# Altium integrated library SH_Library.IntLib: 135 symbols
Pins are listed as number, name and electrical type; pins without a type are passive.

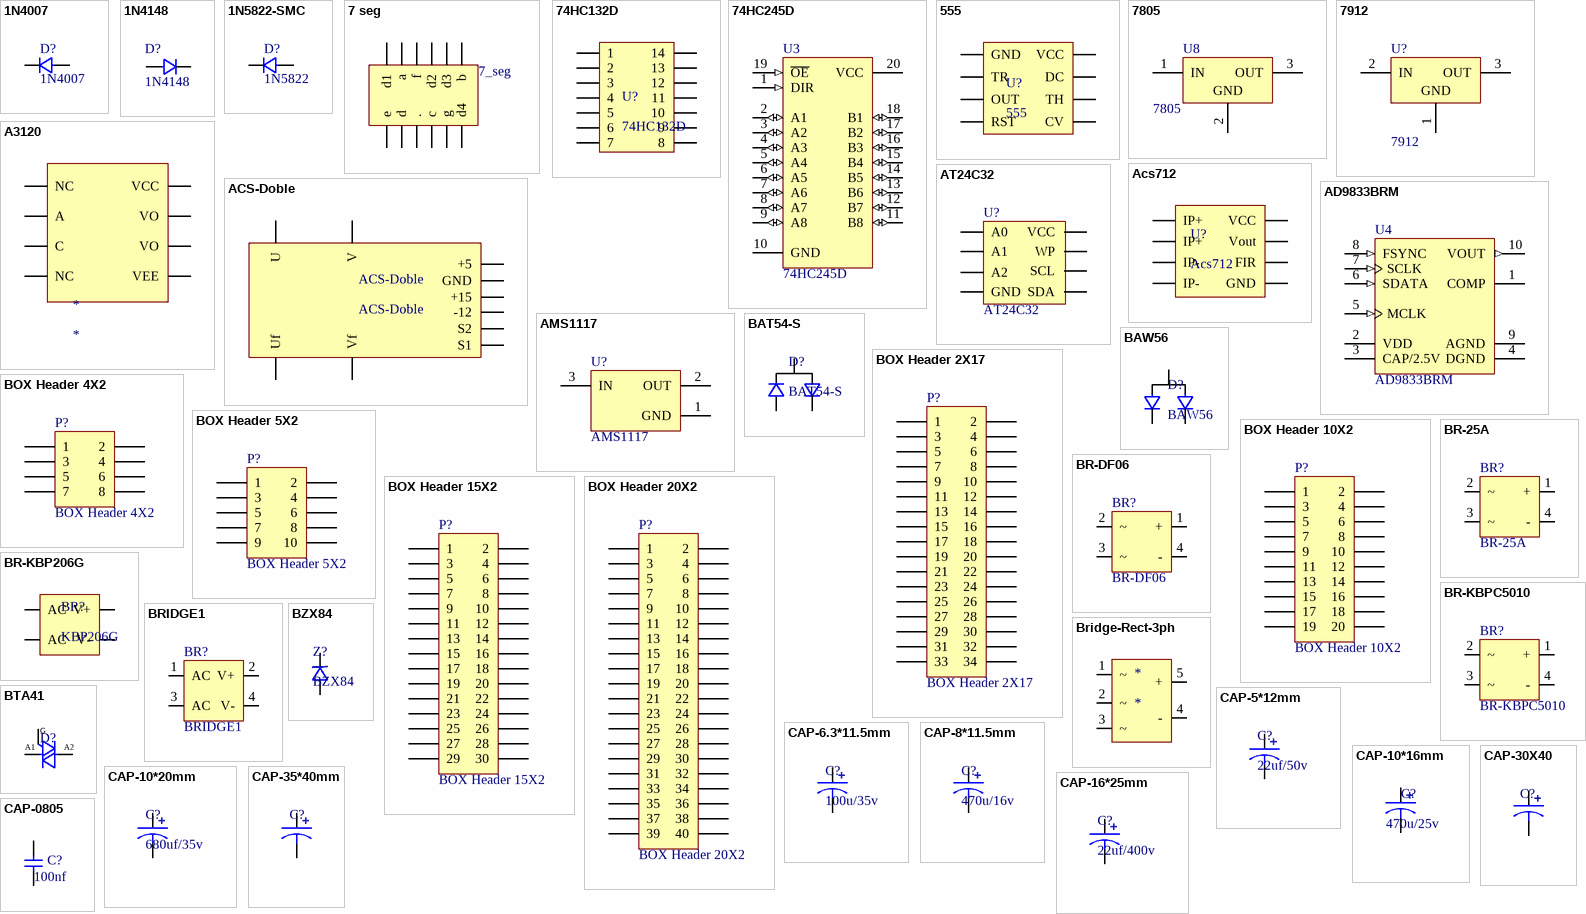
[diagram p0: symbols 1N4007 to CAP-0805]

## 1N4007
designator D?
Diode
footprint DIODE-SMA
footprint DO-41
pins: 1 K, 2 A

## 1N4148
designator D?
Diode
footprint 1N4148
footprint DO-35
pins: 1 A, 2 K

## 1N5822-SMC
designator D?, comment 1N5822
Diode
footprint DIODE-SMC
footprint DO-201AD
pins: 1 K, 2 A

## 7 seg
designator 7_seg, comment 7_seg  (value not drawn)
footprint 7_seg
pins: 1 d1, 2 a, 3 f, 4 d2, 5 d3, 6 b, 7 e, 8 d, 9 ., 10 c, 11 g, 12 d4

## 74HC132D
designator U?
footprint SOIC-7Pin
pins: 1, 2, 3, 4, 5, 6, 7, 8, 9, 10, 11, 12, 13, 14

## 74HC245D
designator U3
Octal 3-State Non-Inverting Bus Transceiver; Published: 15-Apr-2002; LatestRevisionDate: 13-Apr-2006; LatestRevisionNote: IPC-7351 Footprint Added.; DatasheetVersion: Mar-2000; PackageReference: 751D-05; Publisher: Altium Limited; PackageDescription: 20-Pin Small Outline Integrated Circuit 1.27 mm Pitch; ComponentLink1Description: Manufacturer Link; ComponentLink1URL: http://www.onsemi.com/; ComponentLink2Description: Datasheet; ComponentLink2URL: http://www.onsemi.com/pub/Collateral/MC74HC245A-D.PDF
footprint SOIC_20Leads (SOIC, 20-Leads, Body 12.8x7.5mm, Pitch 1.27mm, IPC High Density)
footprint TSSOP-20 Leads (Shrink Small Outline; 20 Leads; Body Width 4.4 mm; Pitch 0.65 mm)
pins: 1 DIR (in), 2 A1 (io), 3 A2 (io), 4 A3 (io), 5 A4 (io), 6 A5 (io), 7 A6 (io), 8 A7 (io), 9 A8 (io), 10 GND (power), 11 B8 (io), 12 B7 (io), 13 B6 (io), 14 B5 (io), 15 B4 (io), 16 B3 (io), 17 B2 (io), 18 B1 (io), 19 ~{OE} (in), 20 VCC (power)

## 555
designator U?
footprint SO-8-N
pins: 1 GND, 2 TR, 3 OUT, 4 RST, 5 CV, 6 TH, 7 DC, 8 VCC

## 7805
designator U8
PartNumber: L7812CV; DatasheetVersion: Nov-2011; PackageVersion: ver3.0; PackageReference: TO220; PackageDescription: TO, Thru-Hole, Vertical, Heatsink Mounted; 3 In-Line Leads; Pitch 2.54 mm; ComponentLink1Description: Manufacturer URL; ComponentLink1URL: http://www.st.com; ComponentLink2Description: Datasheet; ComponentLink2URL: http://www.st.com/internet/com/TECHNICAL_RESOURCES/TECHNICAL_LITERATURE/DATASHEET/CD00000444.pdf; ComponentLink3Description: Package Specification; ComponentLink3URL: http://www.st.com/internet/com/TECHNICAL_RESOURCES/TECHNICAL_LITERATURE/PACKAGE_INFORMATION/CD00004649.pdf
footprint D2PAK
footprint TO-220
footprint TO-252
pins: 1 IN (power), 2 GND (power), 3 OUT (power)

## 7912
designator U?
Three-Terminal Negative Voltage Regulator; Note: Pin 4 is TAB; Pin 2 is trimmed; Published: 15-Apr-2002; DatasheetVersion: 1996; PackageVersion: 1997; PackageReference: 936-03; Publisher: Altium Limited; PackageDescription: D2-PAK/TO-263-AB; 3 Leads (1 Cropped); Body 14.7 (inc. leads) x 10.2 mm (LxW max); ComponentLink1Description: Manufacturer Link; ComponentLink1URL: http://www.onsemi.com/site/products/taxonomy/0,4438,503,00.html; ComponentLink2Description: Datasheet; ComponentLink2URL: http://www.onsemi.com/pub/Collateral/MC7900-D.PDF
footprint TO-252
pins: 1 GND (power), 2 IN (power), 3 OUT (power)

## A3120
designator *
footprint SMD-8
pins: 1 NC, 2 A, 3 C, 4 NC, 5 VEE, 6 VO, 7 VO, 8 VCC

## Acs712
designator U?
footprint SO-8-N
pins: 1 IP+, 2 IP+, 3 IP-, 4 IP-, 5 GND, 6 FIR, 7 Vout, 8 VCC

## ACS-Doble
designator ACS-Doble
footprint ACS-Doble-empty
pins: +5, +15, -12, GND, S1, S2, u U, uf Uf, v V, vf Vf

## AD9833BRM
designator U4
Low Power, 12.65 mW, 2.3 V to 5.5 V, Programmable Waveform Generator, 10-Bit, Serial, RM-10, 50 Tube; Master fclk: 25MHz; Resolution (Bits): 10bit; Tuning Word Width (bits): 28bit; REFCLK Multiplier: No; Compliance Range (V): 650mV; FS Iout (mA nom): 3mA; I Supply total (max): 5.5mA; DatasheetVersion: Rev. D; PackageVersion: 5/8/2005; PackageReference: RM-10; PackageDescription: 10-Lead Mini Small Outline Package [MSOP]; I/O Interface: Serial; Code_JEDEC: MO-187-BA; ComponentLink1Description: Manufacturer URL; ComponentLink1URL: www.analog.com; ComponentLink2Description: Datasheet; ComponentLink2URL: http://www.analog.com/static/imported-files/data_sheets/AD9833.pdf; ComponentLink3Description: Package Specification; ComponentLink3URL: http://www.analog.com/static/imported-files/packages/PKG_PDF/MSOP%28RM%29/RM_10.pdf
footprint TSSOP-10Leads (TSSOP, 10-Leads, Body 3x3mm, Pitch 0.5mm, IPC High Density)
pins: 1 COMP "DAC Bias Pin. This pin is used for decoupling the DAC bias voltage.", 2 VDD (power) "Positive Power Supply for the Analog and Digital Interface Sections. The on-board 2.5 V regulator is also supplied from VDD. VDD can have a value from 2.3 V to 5.5 V. [see datasheet]", 3 CAP/2.5V (power) "The digital circuitry operates from a 2.5 V power supply. This 2.5 V is generated from VDD using an on-board regulator when VDD exceeds 2.7 V. [see datasheet]", 4 DGND (power) "Digital Ground.", 5 MCLK (in) "Digital Clock Input. DDS output frequencies are expressed as a binary fraction of the frequency of MCLK. The output frequency accuracy and phase noise are determined by this clock.", 6 SDATA (in) "Serial Data Input. The 16-bit serial data-word is applied to this input.", 7 SCLK (in) "Serial Clock Input. Data is clocked into the AD9833 on each falling edge of SCLK.", 8 FSYNC (in) "Active Low Control Input. FSYNC is the frame synchronization signal for the input data. When FSYNC is taken low, the internal logic is informed that a new word is being loaded into the device. [see datasheet]", 9 AGND (power) "Analog Ground.", 10 VOUT (out) "Voltage Output. The analog and digital output from the AD9833 is available at this pin. An external load resistor is not required because the device has a 200  ohm resistor on board."

## AMS1117
designator U?
800mA SOT-223; PartNumber: LM1117MP-3.3; Manufacturer: National Semiconductor; PackageTopMarking: XYTT*N05A; PowerWise: N; CompType: LDO IC; High-Reliability: Y; DatasheetVersion: Apr-2006; PackageVersion: revB, Apr-2003; PackageReference: MP04A; PackageDescription: Molded SOT-223, 6.50 x 3.56 x 1.6mm Body, 4 Lead, 2.3mm Pitch; RoHS: N; PinCount: 4; Code_JEDEC: TO-261-AA; Code_IPC: SOT223-4; ComponentLink1Description: Manufacturer URL; ComponentLink1URL: http://www.national.com/; ComponentLink2Description: LM1117 Datasheet; ComponentLink2URL: http://www.national.com/ds/LM/LM1117.pdf; ComponentLink3Description: LM1117 Web Page; ComponentLink3URL: http://www.national.com/pf/LM/LM1117.html; ComponentLink4Description: MP04A Package Page; ComponentLink4URL: http://www.national.com/packaging/folders/mp04a.html
footprint AMS1117-SOT223
pins: 1 GND (power), 2 OUT (power), 3 IN (power)

## AT24C32
designator U?
footprint SO-8-N
pins: 1 A0, 2 A1, 3 A2, 4 GND, 5 SDA, 6 SCL, 7 WP, 8 VCC

## BAT54-S
designator D?
footprint SOT23
pins: 1 K, 2 K, 3

## BAW56
designator D?
footprint SOT23
pins: 1 K, 2 K, 3

## BOX Header 2X17
designator P?
Header, 17-Pin, Dual row; LatestRevisionDate: 17-Jul-2002; LatestRevisionNote: Re-released for DXP Platform.; Publisher: Altium Limited
footprint BOX Header 2X17
footprint BOX Header 2X17 RA
pins: 1, 2, 3, 4, 5, 6, 7, 8, 9, 10, 11, 12, 13, 14, 15, 16, 17, 18, 19, 20, 21, 22, 23, 24, 25, 26, 27, 28, 29, 30, 31, 32, 33, 34

## BOX Header 4X2
designator P?
Header, 4-Pin, Dual row; LatestRevisionDate: 17-Jul-2002; LatestRevisionNote: Re-released for DXP Platform.; Publisher: Altium Limited
footprint BOX-HEADER-2X4
pins: 1, 2, 3, 4, 5, 6, 7, 8

## BOX Header 5X2
designator P?
Header, 5-Pin, Dual row; LatestRevisionDate: 17-Jul-2002; LatestRevisionNote: Re-released for DXP Platform.; Publisher: Altium Limited
footprint BOX-HEADER-2X5
pins: 1, 2, 3, 4, 5, 6, 7, 8, 9, 10

## BOX Header 10X2
designator P?
Header, 10-Pin, Dual row; LatestRevisionDate: 17-Jul-2002; LatestRevisionNote: Re-released for DXP Platform.; Publisher: Altium Limited
footprint BOX-HEADER-2X10
pins: 1, 2, 3, 4, 5, 6, 7, 8, 9, 10, 11, 12, 13, 14, 15, 16, 17, 18, 19, 20

## BOX Header 15X2
designator P?
Header, 15-Pin; LatestRevisionDate: 17-Jul-2002; LatestRevisionNote: Re-released for DXP Platform.; Publisher: Altium Limited
footprint BOX-HEADER-2X15
pins: 1, 2, 3, 4, 5, 6, 7, 8, 9, 10, 11, 12, 13, 14, 15, 16, 17, 18, 19, 20, 21, 22, 23, 24, 25, 26, 27, 28, 29, 30

## BOX Header 20X2
designator P?
Header, 20-Pin, Dual row; LatestRevisionDate: 17-Jul-2002; LatestRevisionNote: Re-released for DXP Platform.; Publisher: Altium Limited
footprint BOX-HEADER-2X20
pins: 1, 2, 3, 4, 5, 6, 7, 8, 9, 10, 11, 12, 13, 14, 15, 16, 17, 18, 19, 20, 21, 22, 23, 24, 25, 26, 27, 28, 29, 30, 31, 32, 33, 34, 35, 36, 37, 38, 39, 40

## BR-25A
designator BR?
footprint BR-25A
pins: 1 +, 2 ~, 3 ~, 4 -

## BR-DF06
designator BR?
footprint DF06
pins: 1 +, 2 ~, 3 ~, 4 -

## BR-KBP206G
designator BR?, comment KBP206G
footprint KBP206G
footprint KBU810
pins: 1 V+, 2 AC, 3 AC, 4 V-

## BR-KBPC5010
designator BR?
footprint KBPC5010
footprint KBPC5010W
pins: 1 +, 2 ~, 3 ~, 4 -

## BRIDGE1
designator BR?
Diode Bridge
footprint BRIDGE1
footprint BR-SMA
pins: 1 AC, 2 V+, 3 AC, 4 V-

## Bridge-Rect-3ph
designator *
footprint Bridge_Rect_3ph
pins: 1 ~, 2 ~, 3 ~, 4 -, 5 +

## BTA41
designator D?  (value not drawn)
footprint TO-264-N
pins: 1, 2 A, 3
text: G; A1; A2

## BZX84
designator Z?
footprint SOT23
pins: 2 K, 3

## CAP-5*12mm
designator C?, comment 22uf/50v
Capacitor
footprint CAP-5*12mm
pins: 1, 2

## CAP-6.3*11.5mm
designator C?, comment 100u/35v
Capacitor
footprint CAP-6.3*11.5mm
pins: 1, 2

## CAP-8*11.5mm
designator C?, comment 470u/16v
Capacitor
footprint CAP-8*11.5mm
pins: 1, 2

## CAP-10*16mm
designator C?, comment 470u/25v
Capacitor
footprint CAP-10*16mm
pins: 1, 2

## CAP-10*20mm
designator C?, comment 680uf/35v
Capacitor
footprint CAP-10*20mm
pins: 1, 2

## CAP-16*25mm
designator C?, comment 22uf/400v
Capacitor
footprint CAP-16*25mm
pins: 1, 2

## CAP-30X40
designator C?  (value not drawn)
footprint CAP-30X40
pins: 1, 2

## CAP-35*40mm
designator C?, comment 680UF/450V  (value not drawn)
Capacitor
footprint CAP-35*40mm
pins: 1, 2

## CAP-0805
designator C?, comment 100nf
Capacitor
footprint cap-0805
pins: 1, 2

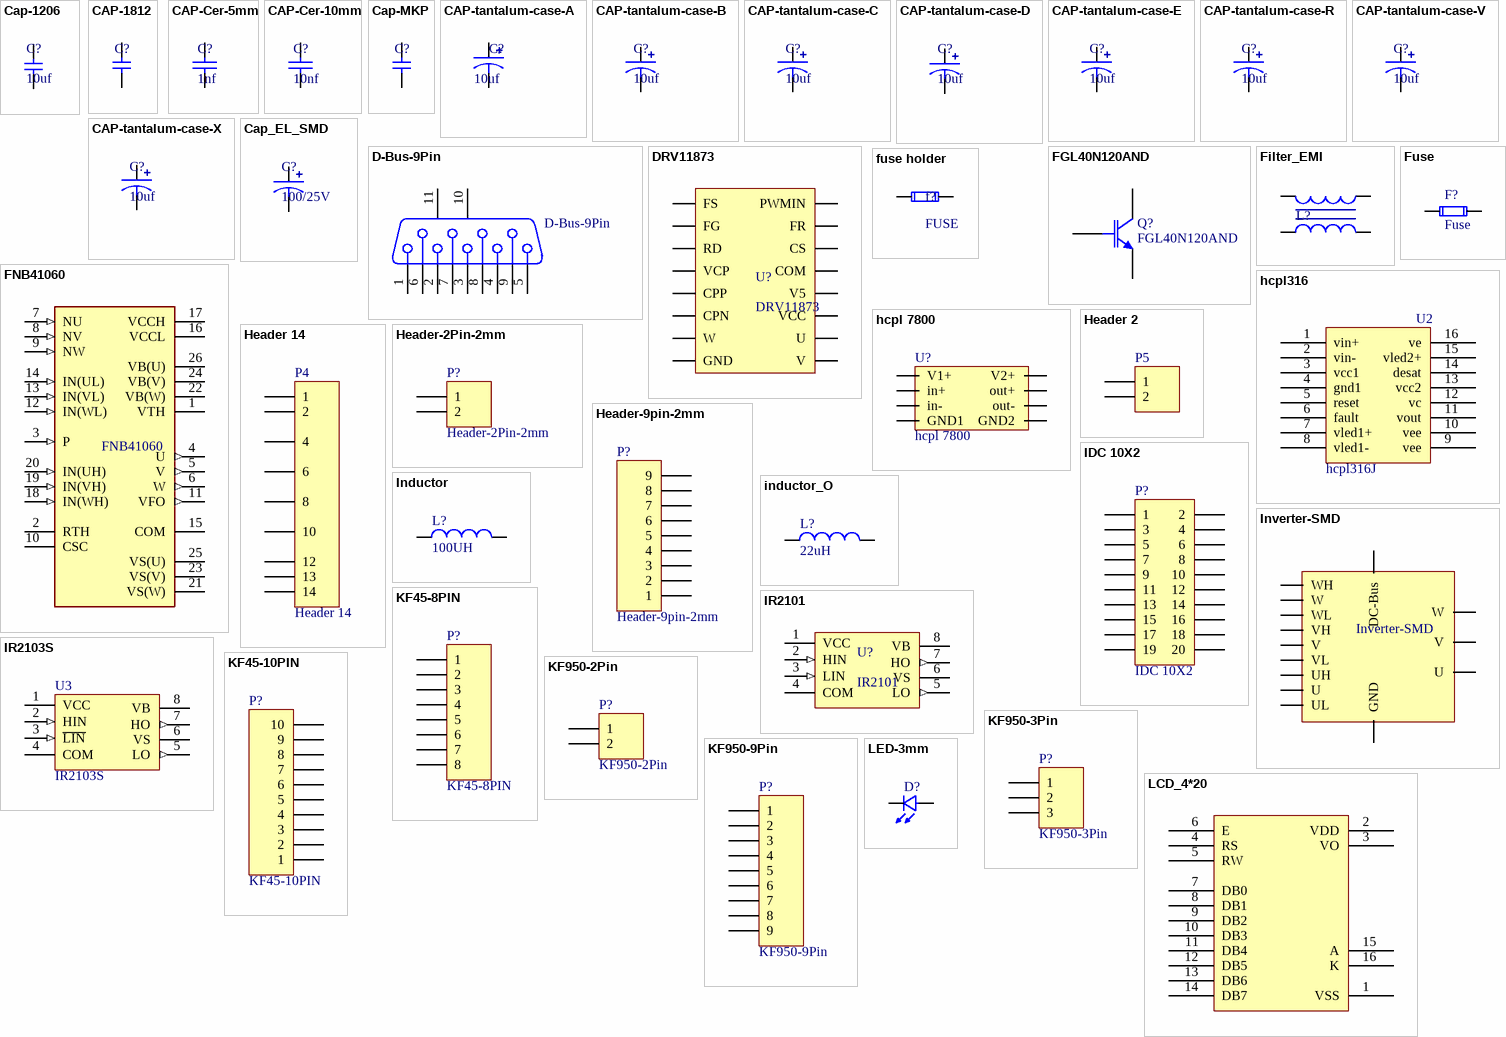
[diagram p1: symbols Cap-1206 to LED-3mm]

## Cap-1206
designator C?, comment 10uf
footprint CAP_1206
pins: 1, 2

## CAP-1812
designator C?  (value not drawn)
footprint CAP-1812
pins: 1, 2

## CAP-Cer-5mm
designator C?, comment 1nf
Capacitor
footprint CAP-Cer-5mm
pins: 1, 2

## CAP-Cer-10mm
designator C?, comment 10nf
Capacitor
footprint CAP-Cer-10mm
pins: 1, 2

## Cap-MKP
designator C?  (value not drawn)
footprint CAP-MKP-W3-H8-L10
footprint CAP-MKP-W6-H12-L18
footprint CAP-MKP-W8-H17-L21
pins: 1, 2

## CAP-tantalum-case-A
designator C?, comment 10uf
Capacitor
footprint TAN-CASE-A
pins: 1, 2

## CAP-tantalum-case-B
designator C?, comment 10uf
Capacitor
footprint TAN-CASE-B
pins: 1, 2

## CAP-tantalum-case-C
designator C?, comment 10uf
Capacitor
footprint TAN-CASE-C
pins: 1, 2

## CAP-tantalum-case-D
designator C?, comment 10uf
Capacitor
footprint TAN-CASE-D
pins: 1, 2

## CAP-tantalum-case-E
designator C?, comment 10uf
Capacitor
footprint TAN-CASE-E
pins: 1, 2

## CAP-tantalum-case-R
designator C?, comment 10uf
Capacitor
footprint TAN-CASE-R
pins: 1, 2

## CAP-tantalum-case-V
designator C?, comment 10uf
Capacitor
footprint TAN-CASE-V
pins: 1, 2

## CAP-tantalum-case-X
designator C?, comment 10uf
Capacitor
footprint TAN-CASE-X
pins: 1, 2

## Cap_EL_SMD
designator C?, comment 100/25V
footprint CAP_SMD-11X10
footprint CAP_SMD-7.3X6.6
footprint CAP-SMD-5X5.4
pins: 1, 2

## D-Bus-9Pin
designator D-Bus-9Pin  (value not drawn)
Receptacle Assembly, 9 Position, Right Angle; PackageDocument: O; Positions: 9; Published: 15-Jun-2001; LatestRevisionDate: 17-Jul-2002; LatestRevisionNote: Re-released for DXP Platform.; DatasheetDocument: 1-Sep-1999; PackageReference: 788750; Publisher: Altium Limited; Orientation: Right Angle; Gender: Receptacle
footprint D-Bus-9Pin
pins: 1, 2, 3, 4, 5, 6, 7, 8, 9, 10 MH1, 11 MH2

## DRV11873
designator U?
footprint TSSOP-16PIN
pins: 1 FS, 2 FG, 3 RD, 4 VCP, 5 CPP, 6 CPN, 7 W, 8 GND, 9 V, 10 U, 11 VCC, 12 V5, 13 COM, 14 CS, 15 FR, 16 PWMIN

## FGL40N120AND
designator Q?
Nch IGBT for Strobe Flasher; Published: 30-Oct-2009; DatasheetVersion: Rev.2.00, Jul-2005; PackageVersion: Sep-2005; PackageReference: PRSS0003AB-A; Publisher: Altium Limited; PackageDescription: TO, Thru-Hole, Vertical, Heatsink Mounted; 3 In-Line Leads; Pitch 2.54 mm (TO-220FN); ComponentLink1Description: Manufacturer Link; ComponentLink1URL: http://sg.renesas.com/fmwk.jsp?cnt=discrete_category_landing.jsp&fp=/products/discrete/; ComponentLink2Description: Datasheet; ComponentLink2URL: http://documentation.renesas.com/eng/products/transistor/rej03g0286_ct40km8h.pdf; ComponentLink3Description: Packaging Specification; ComponentLink3URL: http://sg.renesas.com/media/products/common_info/package/pdf/transistor/code/prss0003ab_a.pdf
footprint TO-264
pins: 1 G, 2 C, 3 E

## Filter_EMI
designator L?
Filter_EMI; Code_IEC: 1005; Value: 10mH; Published: 8-Jun-2000; LatestRevisionDate: 29-May-2009; LatestRevisionNote: IPC-7351 Footprint Added.; PackageReference: 0402-A; Publisher: Altium Limited; PackageDescription: Chip Inductor; Code_JEITA: 0402
footprint FILTER-EMI
footprint FILTER-EMI-2
pins: 1, 2, 3, 4

## FNB41060
designator FNB41060  (value not drawn)
footprint FBN41060
pins: 1 VTH (power), 2 RTH, 3 P (in), 4 U (out), 5 V (out), 6 W (out), 7 NU (in), 8 NV (in), 9 NW (in), 10 CSC, 11 VFO (out), 12 IN(WL) (in), 13 IN(VL) (in), 14 IN(UL) (in), 15 COM (power), 16 VCCL (power), 17 VCCH (power), 18 IN(WH) (in), 19 IN(VH) (in), 20 IN(UH) (in), 21 VS(W) (power), 22 VB(W) (power), 23 VS(V) (power), 24 VB(V) (power), 25 VS(U) (power), 26 VB(U) (power)

## Fuse
designator F?
footprint Fuse-small
footprint Fuse-2
footprint RES-1206
pins: 1, 2

## fuse holder
designator f?, comment FUSE
Resistor; Published: 8-Jun-2000; LatestRevisionDate: 17-Jul-2002; LatestRevisionNote: Re-released for DXP Platform.; PackageReference: AXIAL-0.4; Publisher: Altium Limited; PackageDescription: Axial Device, Thru-Hole; 2 Leads; 0.4 in Pin Spacing
footprint FUSE-HOLDER
footprint FUSE-HOLDER2
footprint FUSE_HOLDER3
pins: 1, 2

## hcpl316
designator U2, comment hcpl316J
footprint hcpl316
pins: 1 vin+, 2 vin-, 3 vcc1, 4 gnd1, 5 reset, 6 fault, 7 vled1+, 8 vled1-, 9 vee, 10 vee, 11 vout, 12 vc, 13 vcc2, 14 desat, 15 vled2+, 16 ve

## hcpl 7800
designator U?
footprint PDIP8 (DIP; 8 Leads; Row Spacing 7.62 mm; Pitch 2.54 mm)
pins: 1 V1+, 2 in+, 3 in-, 4 GND1, 5 GND2, 6 out-, 7 out+, 8 V2+

## Header 2
designator P5
LatestRevisionDate: 17-Jul-2002; LatestRevisionNote: Re-released for DXP Platform.; Publisher: Altium Limited
footprint HEADER-2PIN
footprint XH-2PIN
pins: 1, 2

## Header 14
designator P4
Header, 14-Pin; LatestRevisionDate: 17-Jul-2002; LatestRevisionNote: Re-released for DXP Platform.; Publisher: Altium Limited
footprint 14pin-2.54mm
pins: 1, 2, 4, 6, 8, 10, 12, 13, 14

## Header-2Pin-2mm
designator P?
Header, 2-Pin; LatestRevisionDate: 17-Jul-2002; LatestRevisionNote: Re-released for DXP Platform.; Publisher: Altium Limited
footprint 2PIN-2MM
pins: 1, 2

## Header-9pin-2mm
designator P?
Header, 9-Pin; LatestRevisionDate: 17-Jul-2002; LatestRevisionNote: Re-released for DXP Platform.; Publisher: Altium Limited
footprint 9PIN-2MM
pins: 1, 2, 3, 4, 5, 6, 7, 8, 9

## IDC 10X2
designator P?
LatestRevisionDate: 17-Jul-2002; LatestRevisionNote: Re-released for DXP Platform.; Publisher: Altium Limited
footprint IDC-2X10
pins: 1, 2, 3, 4, 5, 6, 7, 8, 9, 10, 11, 12, 13, 14, 15, 16, 17, 18, 19, 20

## Inductor
designator L?, comment 100UH
Inductor; Code_IEC: 1005; Value: 10mH; Published: 8-Jun-2000; LatestRevisionDate: 29-May-2009; LatestRevisionNote: IPC-7351 Footprint Added.; PackageReference: 0402-A; Publisher: Altium Limited; PackageDescription: Chip Inductor; Code_JEITA: 0402
footprint INDUCTOR-5*5
footprint INDUCATOR-10X10
pins: 1, 2

## inductor_O
designator L?, comment 22uH
Inductance: 470 µH; DatasheetVersion: ver 1, Mar-2010; PackageVersion: 2010; PackageReference: WE-TI-LM-STBG; PackageDescription: THT Inductor, 2-Leads, Body 9.5 x 9.5 mm; ComponentLink1Description: Manufacturer URL; ComponentLink1URL: http://www.we-online.com; ComponentLink2Description: Datasheet; ComponentLink2URL: http://www.we-online.de/katalog/media/pdf/744732471.pdf
footprint INDUCTOR-O
pins: 1, 2

## Inverter-SMD
designator Inverter-SMD  (value not drawn)
footprint Inverter_SMD-D2PACK
footprint Inverter_SMD-TO252
pins: 1 WH, 2 W, 3 WL, 4 VH, 5 V, 6 VL, 7 UH, 8 U, 9 UL, 10 DC-Bus, 11 GND, 12 W, 13 V, 14 U

## IR2101
designator U?
footprint SO-8-N
pins: 1 VCC (power), 2 HIN (in), 3 LIN (in), 4 COM (power), 5 LO (out), 6 VS (power), 7 HO (out), 8 VB (power)

## IR2103S
designator U3
High and Low Side Driver; Published: 8-Jun-2000; LatestRevisionDate: 13-Apr-2006; LatestRevisionNote: IPC-7351 Footprint Added.; DatasheetVersion: PD600451; PackageVersion: Feb-2001; PackageReference: SO-8; Publisher: Altium Limited; PackageDescription: 8-Pin Plastic Small Outline Integrated Circuit 1.27 mm Pitch; Code_JEDEC: MS-012-AA; Code_IPC: SOIC127P600-8; ComponentLink1Description: Manufacturer Link; ComponentLink1URL: http://www.irf.com/; ComponentLink2Description: Datasheet; ComponentLink2URL: http://www.irf.com/product-info/datasheets/data/ir2103.pdf
footprint SO-8-N
pins: 1 VCC (power), 2 HIN (in), 3 ~{LIN} (in), 4 COM (power), 5 LO (out), 6 VS (power), 7 HO (out), 8 VB (power)

## KF45-8PIN
designator P?
LatestRevisionDate: 17-Jul-2002; LatestRevisionNote: Re-released for DXP Platform.; Publisher: Altium Limited
footprint kf45
pins: 1, 2, 3, 4, 5, 6, 7, 8

## KF45-10PIN
designator P?
LatestRevisionDate: 17-Jul-2002; LatestRevisionNote: Re-released for DXP Platform.; Publisher: Altium Limited
footprint KF45-10PIN
pins: 1, 2, 3, 4, 5, 6, 7, 8, 9, 10

## KF950-2Pin
designator P?
LatestRevisionDate: 17-Jul-2002; LatestRevisionNote: Re-released for DXP Platform.; Publisher: Altium Limited
footprint KF950-2Pin
pins: 1, 2

## KF950-3Pin
designator P?
LatestRevisionDate: 17-Jul-2002; LatestRevisionNote: Re-released for DXP Platform.; Publisher: Altium Limited
footprint KF950-3Pin
pins: 1, 2, 3

## KF950-9Pin
designator P?
LatestRevisionDate: 17-Jul-2002; LatestRevisionNote: Re-released for DXP Platform.; Publisher: Altium Limited
footprint KF950-9Pin
pins: 1, 2, 3, 4, 5, 6, 7, 8, 9

## LCD_4*20
designator LCD1  (value not drawn)
Value: *
footprint LCD 4*20
pins: 1 VSS, 2 VDD, 3 VO, 4 RS, 5 RW, 6 E, 7 DB0, 8 DB1, 9 DB2, 10 DB3, 11 DB4, 12 DB5, 13 DB6, 14 DB7, 15 A, 16 K

## LED-3mm
designator D?, comment LED  (value not drawn)
footprint LED-3mm
pins: 1 A, 2 K
